# Altium footprint library ACTION_Connector.PcbLib: 138 footprints (part 6 of 9)
Each footprint in its own frame and in the unit in brackets; x right, y up, seen from the top. Pads: shape width x height; smd on the part's side, far side on the other; paste and mask are expansions set on the pad; w line width, h text height; cw(c..) or ccw(c..) is an arc to the next point about the centre after c.
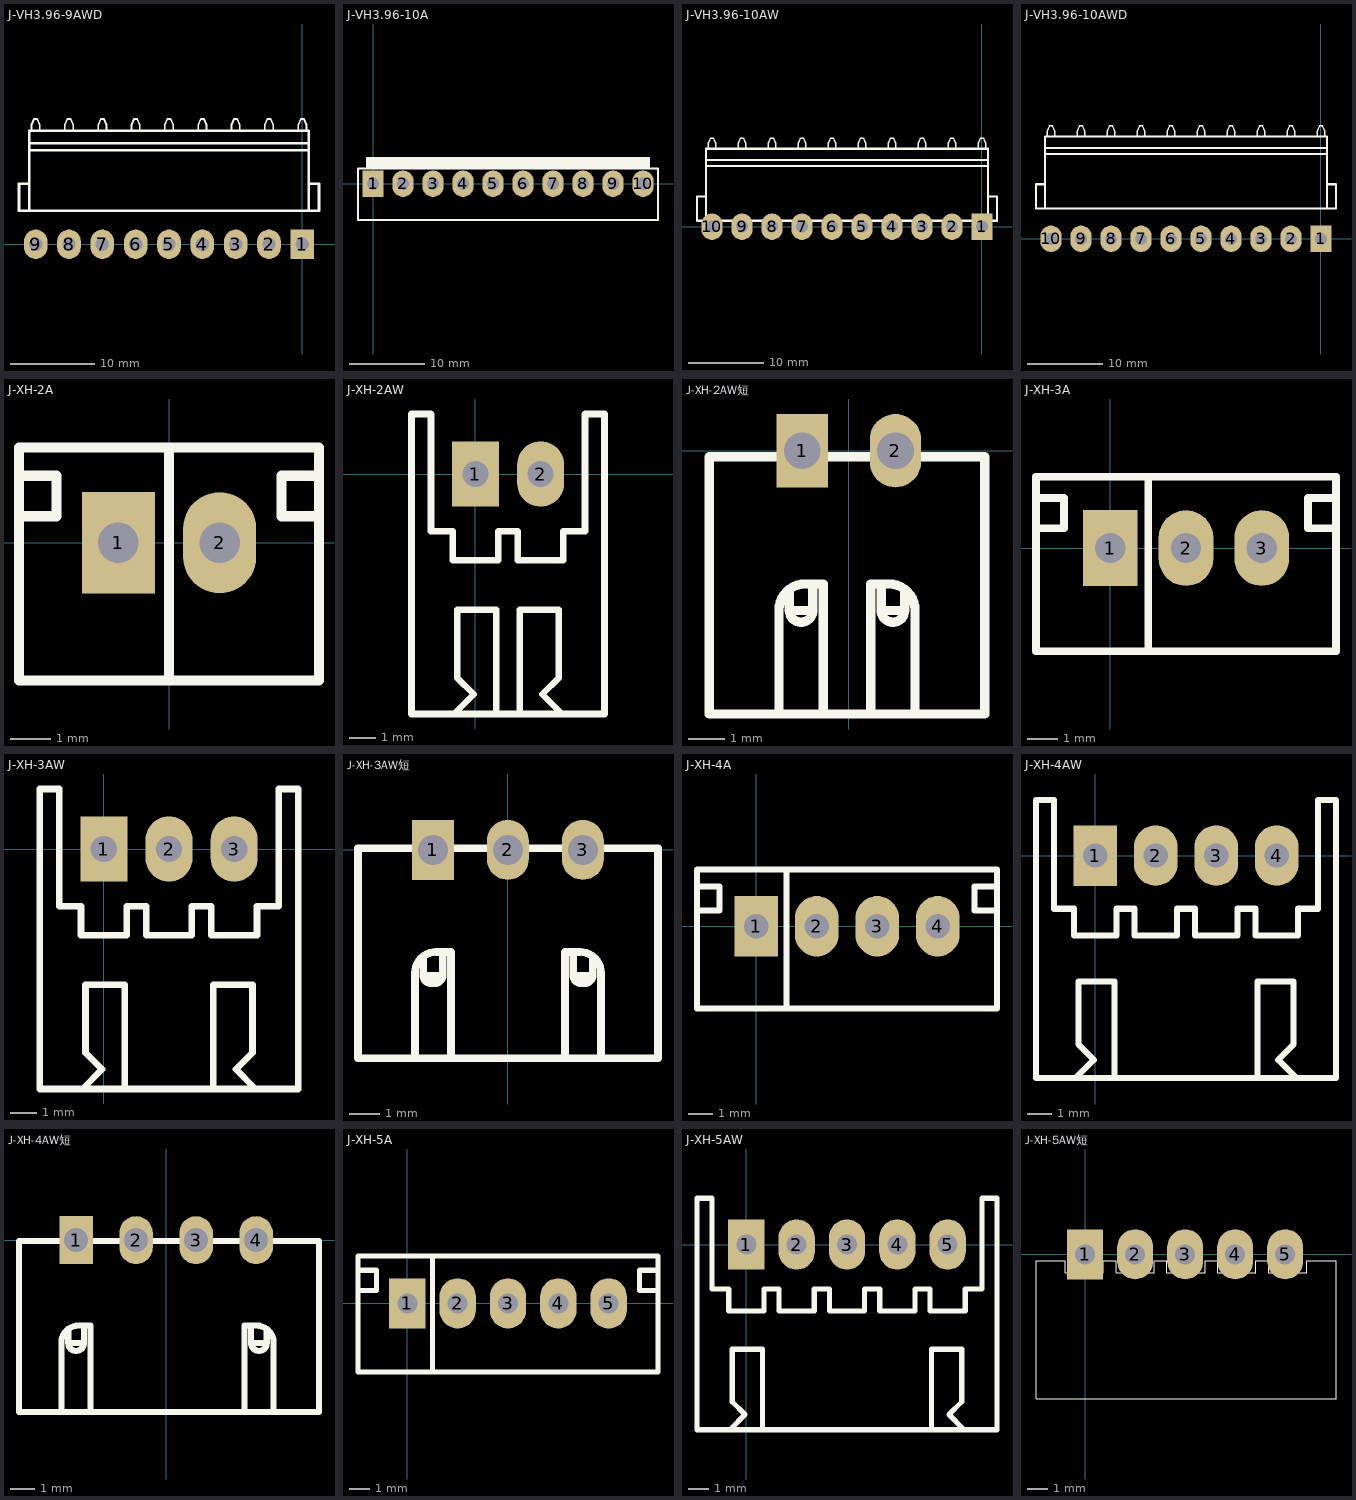
[diagram p5: the footprints below, top view; thin cyan lines are the x and y axes]

## J-VH3.96-9AWD [mm]
pads (9):
  rect 2.8x3.5 hole 1.6: 1(0,0)
  oval 2.8x3.5 hole 1.6: 2(-3.96,0) 3(-7.92,0) 4(-11.88,0) 5(-15.84,0) 6(-19.8,0) 7(-23.76,0) 8(-27.72,0) 9(-31.68,0)
Top Overlay:
  lines w0.2: -32.18,13.5 -32.18,14.2 -31.88,14.9 -31.48,14.9 -31.18,14.2 -31.18,13.5 ; -28.22,13.5 -28.22,14.2 -27.92,14.9 -27.52,14.9 -27.22,14.2 -27.22,13.5 ; -24.26,13.5 -24.26,14.2 -23.96,14.9 -23.56,14.9 -23.26,14.2 -23.26,13.5 ; -20.3,13.5 -20.3,14.2 -20,14.9 -19.6,14.9 -19.3,14.2 -19.3,13.5 ; -16.34,13.5 -16.34,14.2 -16.04,14.9 -15.64,14.9 -15.34,14.2 -15.34,13.5 ; -12.38,13.5 -12.38,14.2 -12.08,14.9 -11.68,14.9 -11.38,14.2 -11.38,13.5 ; -8.42,13.5 -8.42,14.2 -8.12,14.9 -7.72,14.9 -7.42,14.2 -7.42,13.5 ; -4.46,13.5 -4.46,14.2 -4.16,14.9 -3.76,14.9 -3.46,14.2 -3.46,13.5 ; -0.5,13.5 -0.5,14.2 -0.2,14.9 0.2,14.9 0.5,14.2 0.5,13.5
  lines w0.3: -32.46,4 -32.46,13.5 0.78,13.5 0.78,4 ; -32.46,7.2 -33.66,7.2 -33.66,4 1.98,4 1.98,7.2 0.78,7.2 ; -32.46,11.2 0.78,11.2 ; -32.46,12 0.78,12
3D body "VH3.96-9AW.STEP": height 8.4, standoff -3.6, extent -33.66,-0.55 1.98,14.9

## J-VH3.96-10A [mm]
pads (10):
  rect 2.8x3.5 hole 1.6: 1(0,0)
  oval 2.8x3.5 hole 1.6: 2(3.96,0) 3(7.92,0) 4(11.88,0) 5(15.84,0) 6(19.8,0) 7(23.76,0) 8(27.72,0) 9(31.68,0) 10(35.64,0)
Top Overlay:
  lines w0.3: -0.78,2 -0.78,3.4 36.42,3.4 36.42,2 ; -0.78,2.159 36.42,2.159 ; -0.78,2.413 36.42,2.413 ; -0.78,2.667 36.42,2.667 ; -0.78,2.921 36.42,2.921 ; -0.78,3.175 36.42,3.175 ; -1.98,-4.8 -1.98,2 37.62,2 37.62,-4.8 -1.98,-4.8
3D body "VH3.96-10A.STEP": height 14.6, standoff -3.6, extent -1.98,-4.8 37.62,3.6

## J-VH3.96-10AW [mm]
pads (10):
  rect 2.8x3.5 hole 1.6: 1(0,0)
  oval 2.8x3.5 hole 1.6: 2(-3.96,0) 3(-7.92,0) 4(-11.88,0) 5(-15.84,0) 6(-19.8,0) 7(-23.76,0) 8(-27.72,0) 9(-31.68,0) 10(-35.64,0)
Top Overlay:
  lines w0.2: -36.14,10.3 -36.14,11 -35.84,11.7 -35.44,11.7 -35.14,11 -35.14,10.3 ; -32.18,10.3 -32.18,11 -31.88,11.7 -31.48,11.7 -31.18,11 -31.18,10.3 ; -28.22,10.3 -28.22,11 -27.92,11.7 -27.52,11.7 -27.22,11 -27.22,10.3 ; -24.26,10.3 -24.26,11 -23.96,11.7 -23.56,11.7 -23.26,11 -23.26,10.3 ; -20.3,10.3 -20.3,11 -20,11.7 -19.6,11.7 -19.3,11 -19.3,10.3 ; -16.34,10.3 -16.34,11 -16.04,11.7 -15.64,11.7 -15.34,11 -15.34,10.3 ; -12.38,10.3 -12.38,11 -12.08,11.7 -11.68,11.7 -11.38,11 -11.38,10.3 ; -8.42,10.3 -8.42,11 -8.12,11.7 -7.72,11.7 -7.42,11 -7.42,10.3 ; -4.46,10.3 -4.46,11 -4.16,11.7 -3.76,11.7 -3.46,11 -3.46,10.3 ; -0.5,10.3 -0.5,11 -0.2,11.7 0.2,11.7 0.5,11 0.5,10.3
  lines w0.3: -36.42,0.8 -36.42,10.3 0.78,10.3 0.78,0.8 ; -36.42,4 -37.62,4 -37.62,0.8 1.98,0.8 1.98,4 0.78,4 ; -36.42,8 0.78,8 ; -36.42,8.8 0.78,8.8
3D body "VH3.96-10AW.STEP": height 8.4, standoff -3.6, extent -37.62,-0.55 1.98,11.7

## J-VH3.96-10AWD [mm]
pads (10):
  rect 2.8x3.5 hole 1.6: 1(0,0)
  oval 2.8x3.5 hole 1.6: 2(-3.96,0) 3(-7.92,0) 4(-11.88,0) 5(-15.84,0) 6(-19.8,0) 7(-23.76,0) 8(-27.72,0) 9(-31.68,0) 10(-35.64,0)
Top Overlay:
  lines w0.2: -36.14,13.5 -36.14,14.2 -35.84,14.9 -35.44,14.9 -35.14,14.2 -35.14,13.5 ; -32.18,13.5 -32.18,14.2 -31.88,14.9 -31.48,14.9 -31.18,14.2 -31.18,13.5 ; -28.22,13.5 -28.22,14.2 -27.92,14.9 -27.52,14.9 -27.22,14.2 -27.22,13.5 ; -24.26,13.5 -24.26,14.2 -23.96,14.9 -23.56,14.9 -23.26,14.2 -23.26,13.5 ; -20.3,13.5 -20.3,14.2 -20,14.9 -19.6,14.9 -19.3,14.2 -19.3,13.5 ; -16.34,13.5 -16.34,14.2 -16.04,14.9 -15.64,14.9 -15.34,14.2 -15.34,13.5 ; -12.38,13.5 -12.38,14.2 -12.08,14.9 -11.68,14.9 -11.38,14.2 -11.38,13.5 ; -8.42,13.5 -8.42,14.2 -8.12,14.9 -7.72,14.9 -7.42,14.2 -7.42,13.5 ; -4.46,13.5 -4.46,14.2 -4.16,14.9 -3.76,14.9 -3.46,14.2 -3.46,13.5 ; -0.5,13.5 -0.5,14.2 -0.2,14.9 0.2,14.9 0.5,14.2 0.5,13.5
  lines w0.3: -36.42,4 -36.42,13.5 0.78,13.5 0.78,4 ; -36.42,7.2 -37.62,7.2 -37.62,4 1.98,4 1.98,7.2 0.78,7.2 ; -36.42,11.2 0.78,11.2 ; -36.42,12 0.78,12
3D body "VH3.96-10AW.STEP": height 8.4, standoff -3.6, extent -37.62,-0.55 1.98,14.9

## J-XH-2A [mm]
pads (2):
  rect 1.8x2.5 hole 1: 1(-1.25,0)
  oval 1.8x2.5 hole 1: 2(1.25,0)
Top Overlay:
  lines w0.254: -3.7,0.65 -2.774,0.65 -2.774,1.65 -3.7,1.65 ; 0,-3.4 0,2.35 ; 3.7,0.65 2.774,0.65 2.774,1.65 3.7,1.65 ; -3.7,-3.4 3.7,-3.4 3.7,2.35 -3.7,2.35 -3.7,-3.4
3D body "JST-B2B-XH-A.STEP": height 7, standoff -3.4, extent -3.7,-3.4 3.7,2.35

## J-XH-2AW [mm]
pads (2):
  rect 1.8x2.5 hole 1: 1(0,0)
  oval 1.8x2.5 hole 1: 2(2.5,0)
Top Overlay:
  lines w0.254: -0.79,-9.172 -0.064,-8.445 -0.7,-7.809 -0.7,-5.2 0.8,-5.2 0.8,-9.2 ; 1.7,-9.2 1.7,-5.2 3.2,-5.2 3.2,-7.809 2.564,-8.445 3.29,-9.172 ; -2.45,-9.2 4.95,-9.2 4.95,2.3 4.2,2.3 4.2,-2.2 3.375,-2.2 3.375,-3.3 1.625,-3.3 1.625,-2.2 0.875,-2.2 0.875,-3.3 -0.875,-3.3 -0.875,-2.2 -1.7,-2.2 -1.7,2.3 -2.45,2.3 -2.45,-9.2
3D body "JST-S2B-XH-A.STEP": height 6.1, standoff -3.4, extent -2.45,-9.2 4.95,2.3

## J-XH-2AW短 [mm]
pads (2):
  rect 1.4x2 hole 1: 1(-1.27,0)
  oval 1.4x2 hole 1: 2(1.27,0)
Top Overlay:
  lines w0.254: -1.62,-3.769 -1.62,-4.347 ; -0.98,-3.629 -0.98,-4.347 ; 0.88,-3.629 0.88,-4.347 ; 1.52,-3.769 1.52,-4.347 ; -1.9,-7.167 -1.9,-4.329 cw(c-1.2,-4.329) -1.2,-3.629 -0.7,-3.629 -0.7,-7.167 ; -1.9,-7.167 -3.8,-7.167 -3.8,-0.167 3.7,-0.167 3.7,-7.167 1.8,-7.167 ; -1.9,-7.167 -0.7,-7.167 ; -1.62,-4.347 ccw(c-1.3,-4.347) -0.98,-4.347 ; -1.62,-4.347 -0.98,-4.347 ; -0.7,-7.167 0.6,-7.167 ; 0.6,-7.167 0.6,-3.629 1.1,-3.629 cw(c1.1,-4.329) 1.8,-4.329 1.8,-7.167 ; 0.6,-7.167 1.8,-7.167 ; 0.88,-4.347 ccw(c1.2,-4.347) 1.52,-4.347 ; 0.88,-4.347 1.52,-4.347
3D body "User Library-JST-XH-2_5mm-2.STEP": height 5.95, standoff -3.35, extent -3.801,-7.305 3.699,0.335

## J-XH-3A [mm]
pads (3):
  rect 1.8x2.5 hole 1: 1(0,0)
  oval 1.8x2.5 hole 1: 2(2.5,0) 3(5,0)
Top Overlay:
  lines w0.254: -2.45,0.65 -1.524,0.65 -1.524,1.65 -2.45,1.65 ; 1.25,-3.4 1.25,2.35 ; 7.45,0.65 6.524,0.65 6.524,1.65 7.45,1.65 ; -2.45,-3.4 -2.45,2.35 7.45,2.35 7.45,-3.4 -2.45,-3.4
3D body "JST-B3B-XH-A.STEP": height 7, standoff -3.4, extent -2.45,-3.4 7.45,2.35

## J-XH-3AW [mm]
pads (3):
  rect 1.8x2.5 hole 1: 1(0,0)
  oval 1.8x2.5 hole 1: 2(2.5,0) 3(5,0)
Top Overlay:
  lines w0.254: -0.79,-9.172 -0.064,-8.445 -0.7,-7.809 -0.7,-5.2 0.8,-5.2 0.8,-9.2 ; 4.2,-9.2 4.2,-5.2 5.7,-5.2 5.7,-7.809 5.064,-8.445 5.79,-9.172 ; -2.45,-9.2 7.45,-9.2 7.45,2.3 6.7,2.3 6.7,-2.2 5.875,-2.2 5.875,-3.3 4.125,-3.3 4.125,-2.2 3.375,-2.2 3.375,-3.3 1.625,-3.3 1.625,-2.2 0.875,-2.2 0.875,-3.3 -0.875,-3.3 -0.875,-2.2 -1.7,-2.2 -1.7,2.3 -2.45,2.3 -2.45,-9.2
3D body "JST-S3B-XH-A.STEP": height 6.1, standoff -3.4, extent -2.45,-9.2 7.45,2.3

## J-XH-3AW短 [mm]
pads (3):
  rect 1.4x2 hole 1: 1(-2.5,0)
  oval 1.4x2 hole 1: 2(0,0) 3(2.5,0)
Top Overlay:
  lines w0.254: -2.815,-3.542 -2.815,-4.19 ; -2.175,-3.402 -2.175,-4.19 ; 2.185,-3.402 2.185,-4.19 ; 2.825,-3.542 2.825,-4.19 ; -3.095,-6.94 -1.895,-6.94 ; -3.095,-6.94 -4.995,-6.94 -4.995,0.06 5.005,0.06 5.005,-6.94 3.105,-6.94 ; -3.095,-6.94 -3.095,-4.102 cw(c-2.395,-4.102) -2.395,-3.402 -1.895,-3.402 -1.895,-6.94 ; -2.815,-4.19 ccw(c-2.565,-4.19) -2.565,-4.44 -2.425,-4.44 ccw(c-2.425,-4.19) -2.175,-4.19 ; -2.815,-4.19 -2.175,-4.19 ; -1.895,-6.94 1.905,-6.94 ; 1.905,-6.94 3.105,-6.94 ; 1.905,-6.94 1.905,-3.402 2.405,-3.402 cw(c2.405,-4.102) 3.105,-4.102 3.105,-6.94 ; 2.185,-4.19 ccw(c2.435,-4.19) 2.435,-4.44 2.575,-4.44 ccw(c2.575,-4.19) 2.825,-4.19 ; 2.185,-4.19 2.825,-4.19
3D body "User Library-JST-XH-2_5mm-3.STEP": height 5.95, standoff -3.35, extent -5,-7 5,0.64

## J-XH-4A [mm]
pads (4):
  rect 1.8x2.5 hole 1: 1(0,0)
  oval 1.8x2.5 hole 1: 2(2.5,0) 3(5,0) 4(7.5,0)
Top Overlay:
  lines w0.254: -2.45,0.65 -1.524,0.65 -1.524,1.65 -2.45,1.65 ; 1.25,-3.4 1.25,2.35 ; 9.95,0.65 9.024,0.65 9.024,1.65 9.95,1.65 ; -2.45,-3.4 9.95,-3.4 9.95,2.35 -2.45,2.35 -2.45,-3.4
3D body "JST-B4B-XH-A.STEP": height 7, standoff -3.4, extent -2.45,-3.4 9.95,2.35

## J-XH-4AW [mm]
pads (4):
  rect 1.8x2.5 hole 1: 1(0,0)
  oval 1.8x2.5 hole 1: 2(2.5,0) 3(5,0) 4(7.5,0)
Top Overlay:
  lines w0.254: -0.79,-9.172 -0.064,-8.445 -0.7,-7.809 -0.7,-5.2 0.8,-5.2 0.8,-9.2 ; 6.7,-9.2 6.7,-5.2 8.2,-5.2 8.2,-7.809 7.564,-8.445 8.29,-9.172 ; -2.45,-9.2 9.95,-9.2 9.95,2.3 9.2,2.3 9.2,-2.2 8.375,-2.2 8.375,-3.3 6.625,-3.3 6.625,-2.2 5.875,-2.2 5.875,-3.3 4.125,-3.3 4.125,-2.2 3.375,-2.2 3.375,-3.3 1.625,-3.3 1.625,-2.2 0.875,-2.2 0.875,-3.3 -0.875,-3.3 -0.875,-2.2 -1.7,-2.2 -1.7,2.3 -2.45,2.3 -2.45,-9.2
3D body "JST-S4B-XH-A.STEP": height 6.1, standoff -3.4, extent -2.45,-9.2 9.95,2.3

## J-XH-4AW短 [mm]
pads (4):
  rect 1.4x2 hole 1: 1(-3.75,0)
  oval 1.4x2 hole 1: 2(-1.25,0) 3(1.25,0) 4(3.75,0)
Top Overlay:
  lines w0.254: -4.076,-3.702 -4.076,-4.29 ; -3.425,-3.56 -3.425,-4.29 ; 3.544,-3.56 3.544,-4.29 ; 4.195,-3.702 4.195,-4.29 ; -4.36,-7.155 -3.141,-7.155 ; -4.36,-7.155 -6.127,-7.155 -6.127,-0.043 6.37,-0.043 6.37,-7.155 4.479,-7.155 ; -4.36,-7.155 -4.36,-4.271 cw(c-3.649,-4.271) -3.649,-3.56 -3.141,-3.56 -3.141,-7.155 ; -4.076,-4.29 ccw(c-3.75,-4.29) -3.425,-4.29 ; -4.076,-4.29 -3.425,-4.29 ; -3.141,-7.155 3.26,-7.155 ; 3.26,-7.155 3.26,-3.56 3.768,-3.56 cw(c3.768,-4.271) 4.479,-4.271 4.479,-7.155 ; 3.26,-7.155 4.479,-7.155 ; 3.544,-4.29 ccw(c3.87,-4.29) 4.195,-4.29 ; 3.544,-4.29 4.195,-4.29
3D body "User Library-XH2_54-4P-AW.STEP": height 5.9, standoff -3, extent -6.147,-7.229 6.353,0.371

## J-XH-5A [mm]
pads (5):
  rect 1.8x2.5 hole 1: 1(0,0)
  oval 1.8x2.5 hole 1: 2(2.5,0) 3(5,0) 4(7.5,0) 5(10,0)
Top Overlay:
  lines w0.254: -2.45,0.65 -1.524,0.65 -1.524,1.65 -2.45,1.65 ; 1.25,-3.4 1.25,2.35 ; 12.45,0.65 11.524,0.65 11.524,1.65 12.45,1.65 ; -2.45,-3.4 12.45,-3.4 12.45,2.35 -2.45,2.35 -2.45,-3.4
3D body "JST-B5B-XH-A.STEP": height 7, standoff -3.4, extent -2.45,-3.4 12.45,2.35

## J-XH-5AW [mm]
pads (5):
  rect 1.8x2.5 hole 1: 1(0,0)
  oval 1.8x2.5 hole 1: 2(2.5,0) 3(5,0) 4(7.5,0) 5(10,0)
Top Overlay:
  lines w0.254: -0.79,-9.172 -0.064,-8.445 -0.7,-7.809 -0.7,-5.2 0.8,-5.2 0.8,-9.2 ; 9.2,-9.2 9.2,-5.2 10.7,-5.2 10.7,-7.809 10.064,-8.445 10.79,-9.172 ; -2.45,-9.2 -2.45,2.3 -1.7,2.3 -1.7,-2.2 -0.875,-2.2 -0.875,-3.3 0.875,-3.3 0.875,-2.2 1.625,-2.2 1.625,-3.3 3.375,-3.3 3.375,-2.2 4.125,-2.2 4.125,-3.3 5.875,-3.3 5.875,-2.2 6.625,-2.2 6.625,-3.3 8.375,-3.3 8.375,-2.2 9.125,-2.2 9.125,-3.3 10.875,-3.3 10.875,-2.2 11.7,-2.2 11.7,2.3 12.45,2.3 12.45,-9.2 -2.45,-9.2
3D body "JST-S5B-XH-A.STEP": height 6.1, standoff -3.4, extent -2.45,-9.2 12.45,2.3

## J-XH-5AW短 [mm]
pads (5):
  rect 1.8x2.5 hole 1: 1(0,0)
  oval 1.8x2.5 hole 1: 2(2.5,0) 3(5,0) 4(7.5,0) 5(10,0)
Top Overlay:
  lines w0.013: -0.291,-0.921 -0.291,-0.34 ; 0.209,-0.921 0.209,-0.34 ; 2.249,-0.921 2.249,-0.34 ; 2.749,-0.921 2.749,-0.34 ; 4.789,-0.921 4.789,-0.34 ; 5.289,-0.921 5.289,-0.34 ; 7.329,-0.921 7.329,-0.34 ; 7.829,-0.921 7.829,-0.34 ; 9.869,-0.921 9.869,-0.34 ; 10.369,-0.921 10.369,-0.34 ; -0.291,-0.34 -0.291,0.001 ; -0.291,-0.34 0.209,-0.34 ; -0.291,0.001 0.209,0.001 ; -0.291,0.001 -0.291,0.005 ; -0.291,0.005 0.209,0.005 ; -0.291,0.005 -0.291,0.505 0.209,0.505 0.209,0.005 ; 0.209,-0.34 0.209,0.001 ; 0.209,0.001 0.209,0.005 ; 2.249,-0.34 2.249,0.001 ; 2.249,-0.34 2.749,-0.34 ; 2.249,0.001 2.249,0.005 ; 2.249,0.001 2.749,0.001 ; 2.249,0.005 2.249,0.505 2.749,0.505 2.749,0.005 ; 2.249,0.005 2.749,0.005 ; 2.749,-0.34 2.749,0.001 ; 2.749,0.001 2.749,0.005 ; 4.789,-0.34 4.789,0.001 ; 4.789,-0.34 5.289,-0.34 ; 4.789,0.001 5.289,0.001 ; 4.789,0.001 4.789,0.005 ; 4.789,0.005 5.289,0.005 ; 4.789,0.005 4.789,0.505 5.289,0.505 5.289,0.005 ; 5.289,-0.34 5.289,0.001 ; 5.289,0.001 5.289,0.005 ; 7.329,-0.34 7.329,0.001 ; 7.329,-0.34 7.829,-0.34 ; 7.329,0.001 7.829,0.001 ; 7.329,0.001 7.329,0.005 ; 7.329,0.005 7.829,0.005 ; 7.329,0.005 7.329,0.505 7.829,0.505 7.829,0.005 ; 7.829,-0.34 7.829,0.001 ; 7.829,0.001 7.829,0.005 ; 9.869,-0.34 9.869,0.001 ; 9.869,-0.34 10.369,-0.34 ; 9.869,0.001 10.369,0.001 ; 9.869,0.001 9.869,0.005 ; 9.869,0.005 10.369,0.005 ; 9.869,0.005 9.869,0.505 10.369,0.505 10.369,0.005 ; 10.369,-0.34 10.369,0.001 ; 10.369,0.001 10.369,0.005 ; -2.461,-7.221 -2.461,-0.321 -0.991,-0.321 -0.991,-0.921 0.909,-0.921 0.909,-0.321 1.549,-0.321 1.549,-0.921 3.449,-0.921 3.449,-0.321 4.089,-0.321 4.089,-0.921 5.989,-0.921 5.989,-0.321 6.629,-0.321 6.629,-0.921 8.529,-0.921 8.529,-0.321 9.169,-0.321 9.169,-0.921 11.069,-0.921 11.069,-0.321 12.539,-0.321 12.539,-7.221 -2.461,-7.221
3D body "User Library-XH2_54-5P.STEP": height 5.71, standoff -1.54, extent -2.458,-7.179 12.542,0.546